# Altium footprint library 2.54-华普微电子模块.PcbLib: 59 footprints (part 4 of 4)
Each footprint in its own frame and in the unit in brackets; x right, y up, seen from the top. Pads: shape width x height; smd on the part's side, far side on the other; paste and mask are expansions set on the pad; w line width, h text height; cw(c..) or ccw(c..) is an arc to the next point about the centre after c.
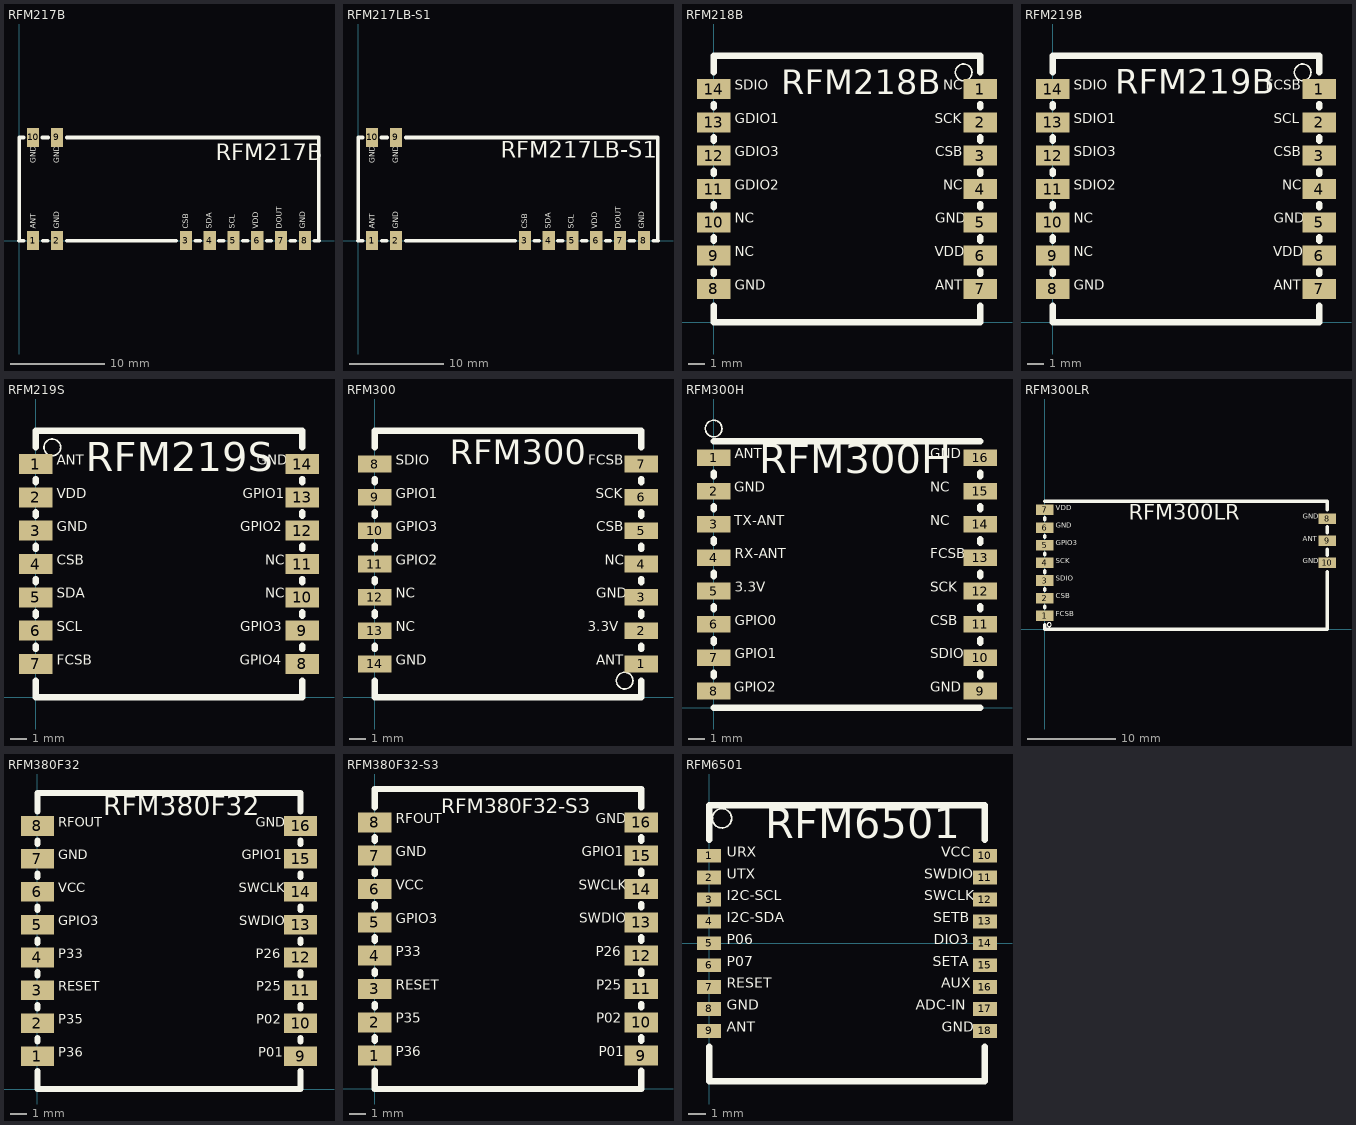
[diagram p3: the footprints below, top view; thin cyan lines are the x and y axes]

## RFM217B [mm]
pads (10):
  rect 1.3x2 smd: 1(1.5,0) 2(4.04,0) 3(17.8,0) 4(20.34,0) 5(22.88,0) 6(25.42,0) 7(27.96,0) 8(30.5,0) 9(4.04,11.01) 10(1.5,11.01)
Top Overlay:
  lines w0.381: -0.004,0 0.504,0 ; 0.5,0 0,0 0,11 0.5,11 ; 2.5,11 3.1,11 ; 2.54,0 3.048,0 ; 5.08,0 16.764,0 ; 5.1,11 32,11 32,0 ; 18.796,0 19.304,0 ; 21.336,0 21.844,0 ; 23.876,0 24.384,0 ; 26.416,0 26.924,0 ; 28.956,0 29.464,0 ; 31.496,0 32.004,0
  text "RFM217B" at 21,8 h3
  text "ANT" at 2,1.25 h1
  text "GND" at 4.5,1.25 h1
  text "CSB" at 18.25,1.25 h1
  text "SDA" at 20.75,1.25 h1
  text "SCL" at 23.25,1.25 h1
  text "VDD" at 25.75,1.25 h1
  text "DOUT" at 28.25,1.25 h1
  text "GND" at 30.75,1.25 h1
  text "GND" at 4.5,8.25 h1
  text "GND" at 2,8.25 h1

## RFM217LB-S1 [mm]
pads (10):
  rect 1.3x2 smd: 1(1.5,0) 2(4.04,0) 3(17.8,0) 4(20.34,0) 5(22.88,0) 6(25.42,0) 7(27.96,0) 8(30.5,0) 9(4.04,11.01) 10(1.5,11.01)
Top Overlay:
  lines w0.381: -0.004,0 0.504,0 ; 0.5,0 0,0 0,11 0.5,11 ; 2.5,11 3.1,11 ; 2.54,0 3.048,0 ; 5.08,0 16.764,0 ; 5.1,11 32,11 32,0 ; 18.796,0 19.304,0 ; 21.336,0 21.844,0 ; 23.876,0 24.384,0 ; 26.416,0 26.924,0 ; 28.956,0 29.464,0 ; 31.496,0 32.004,0
  text "GND" at 2,8.25 h1
  text "GND" at 4.5,8.25 h1
  text "GND" at 30.75,1.25 h1
  text "DOUT" at 28.25,1.25 h1
  text "VDD" at 25.75,1.25 h1
  text "SCL" at 23.25,1.25 h1
  text "SDA" at 20.75,1.25 h1
  text "CSB" at 18.25,1.25 h1
  text "GND" at 4.5,1.25 h1
  text "ANT" at 2,1.25 h1
  text "RFM217LB-S1" at 15.25,8.25 h3

## RFM218B [mm]
pads (14):
  rect 2x1.2 smd: 1(16,14) 2(16,12) 3(16,10) 4(16,8) 5(16,6) 6(16,4) 7(16,2) 8(0,2) 9(0,4) 10(0,6) 11(0,8) 12(0,10) 13(0,12) 14(0,14)
Top Overlay:
  circle w0.1: c15,15 r0.5
  lines w0.381: 0,1 0,0 16,0 16,1 ; 0,2.9 0,3.1 ; 0,4.9 0,5.1 ; 0,6.9 0,7.1 ; 0,8.9 0,9.1 ; 0,10.9 0,11.1 ; 0,12.9 0,13.1 ; 0,15 0,16 16,16 16,15 ; 16,2.9 16,3.1 ; 16,4.9 16,5.1 ; 16,6.9 16,7.1 ; 16,8.9 16,9.1 ; 16,10.9 16,11.1 ; 16,12.9 16,13.1
  text "ANT" at 13.284,1.75 h1
  text "VDD" at 13.267,3.75 h1
  text "GND" at 13.295,5.75 h1
  text "NC" at 13.789,7.75 h1
  text "CSB" at 13.291,9.75 h1
  text "SCK" at 13.275,11.75 h1
  text "NC" at 13.789,13.75 h1
  text "GND" at 1.25,1.75 h1
  text "NC" at 1.25,3.75 h1
  text "NC" at 1.25,5.75 h1
  text "GDIO2" at 1.25,7.75 h1
  text "GDIO3" at 1.25,9.75 h1
  text "GDIO1" at 1.25,11.75 h1
  text "SDIO" at 1.25,13.75 h1
  text "RFM218B" at 4.064,13.208 h2.5

## RFM219B [mm]
pads (14):
  rect 2x1.2 smd: 1(16,14) 2(16,12) 3(16,10) 4(16,8) 5(16,6) 6(16,4) 7(16,2) 8(0,2) 9(0,4) 10(0,6) 11(0,8) 12(0,10) 13(0,12) 14(0,14)
Top Overlay:
  circle w0.1: c15,15 r0.5
  lines w0.381: 0,1 0,0 16,0 16,1 ; 0,2.9 0,3.1 ; 0,4.9 0,5.1 ; 0,6.9 0,7.1 ; 0,8.9 0,9.1 ; 0,10.9 0,11.1 ; 0,12.9 0,13.1 ; 0,15 0,16 16,16 16,15 ; 16,2.9 16,3.1 ; 16,4.9 16,5.1 ; 16,6.9 16,7.1 ; 16,8.9 16,9.1 ; 16,10.9 16,11.1 ; 16,12.9 16,13.1
  text "RFM219B" at 3.75,13.25 h2.5
  text "SDIO" at 1.25,13.75 h1
  text "SDIO1" at 1.25,11.75 h1
  text "SDIO3" at 1.25,9.75 h1
  text "SDIO2" at 1.25,7.75 h1
  text "NC" at 1.25,5.75 h1
  text "NC" at 1.25,3.75 h1
  text "GND" at 1.25,1.75 h1
  text "FCSB" at 12.781,13.75 h1
  text "SCL" at 13.275,11.75 h1
  text "CSB" at 13.268,9.75 h1
  text "NC" at 13.766,7.75 h1
  text "GND" at 13.272,5.75 h1
  text "VDD" at 13.244,3.75 h1
  text "ANT" at 13.261,1.75 h1

## RFM219S [mm]
pads (14):
  rect 2x1.2 smd: 1(0,14) 2(0,12) 3(0,10) 4(0,8) 5(0,6) 6(0,4) 7(0,2) 8(16,2) 9(16,4) 10(16,6) 11(16,8) 12(16,10) 13(16,12) 14(16,14)
Top Overlay:
  circle w0.1: c1,15 r0.5
  lines w0.381: 0,1 0,0 16,0 16,1 ; 0,2.9 0,3.1 ; 0,4.9 0,5.1 ; 0,6.9 0,7.1 ; 0,8.9 0,9.1 ; 0,10.9 0,11.1 ; 0,12.9 0,13.1 ; 0,15 0,16 16,16 16,15 ; 16,2.9 16,3.1 ; 16,4.9 16,5.1 ; 16,6.9 16,7.1 ; 16,8.9 16,9.1 ; 16,10.9 16,11.1 ; 16,12.9 16,13.1
  text "GPIO4" at 12.25,1.75 h1
  text "GPIO3" at 12.289,3.75 h1
  text "NC" at 13.766,5.75 h1
  text "NC" at 13.766,7.75 h1
  text "GPIO2" at 12.289,9.75 h1
  text "GPIO1" at 12.433,11.75 h1
  text "GND" at 13.272,13.75 h1
  text "FCSB" at 1.25,1.75 h1
  text "SCL" at 1.25,3.75 h1
  text "SDA" at 1.25,5.75 h1
  text "CSB" at 1.25,7.75 h1
  text "GND" at 1.25,9.75 h1
  text "VDD" at 1.25,11.75 h1
  text "ANT" at 1.25,13.75 h1
  text "RFM219S" at 3,13 h3

## RFM300 [mm]
pads (14):
  rect 2x1 smd: 1(16,2) 2(16,4) 3(16,6) 4(16,8) 5(16,10) 6(16,12) 7(16,14) 8(0,14) 9(0,12) 10(0,10) 11(0,8) 12(0,6) 13(0,4) 14(0,2)
Top Overlay:
  circle w0.1: c15,1 r0.5
  lines w0.381: 0,1 0,0 16,0 16,1 ; 0,2.9 0,3.1 ; 0,4.9 0,5.1 ; 0,6.9 0,7.1 ; 0,8.9 0,9.1 ; 0,10.9 0,11.1 ; 0,12.9 0,13.1 ; 0,15 0,16 16,16 16,15 ; 16,2.9 16,3.1 ; 16,4.9 16,5.1 ; 16,6.9 16,7.1 ; 16,8.9 16,9.1 ; 16,10.9 16,11.1 ; 16,12.9 16,13.1
  text "ANT" at 13.288,1.75 h1
  text "3.3V" at 12.784,3.75 h1
  text "GND" at 13.299,5.75 h1
  text "NC" at 13.794,7.75 h1
  text "CSB" at 13.296,9.75 h1
  text "SCK" at 13.28,11.75 h1
  text "FCSB" at 12.808,13.75 h1
  text "GND" at 1.25,1.75 h1
  text "NC" at 1.25,3.75 h1
  text "NC" at 1.25,5.75 h1
  text "GPIO2" at 1.25,7.75 h1
  text "GPIO3" at 1.25,9.75 h1
  text "GPIO1" at 1.25,11.75 h1
  text "SDIO" at 1.25,13.75 h1
  text "RFM300" at 4.5,13.5 h2.5

## RFM300H [mm]
pads (16):
  rect 2x1 smd: 1(0,15) 2(0,13) 3(0,11) 4(0,9) 5(0,7) 6(0,5) 7(0,3) 8(0,1) 9(16,1) 10(16,3) 11(16,5) 12(16,7) 13(16,9) 14(16,11) 15(16,13) 16(16,15)
Top Overlay:
  circle w0.1: c0,16.75 r0.5
  lines w0.381: 0,0 16,0 ; 0,1.9 0,2.1 ; 0,3.9 0,4.1 ; 0,5.9 0,6.1 ; 0,7.9 0,8.1 ; 0,9.9 0,10.1 ; 0,11.9 0,12.1 ; 0,13.9 0,14.1 ; 0,16 16,16 ; 16,1.9 16,2.1 ; 16,3.9 16,4.1 ; 16,5.9 16,6.1 ; 16,7.9 16,8.1 ; 16,9.9 16,10.1 ; 16,11.9 16,12.1 ; 16,13.9 16,14.1
  text "RFM300H" at 2.75,13.5 h3
  text "ANT" at 1.25,14.75 h1
  text "GND" at 1.249,12.75 h1
  text "TX-ANT" at 1.249,10.75 h1
  text "RX-ANT" at 1.25,8.75 h1
  text "GPIO2" at 1.249,0.75 h1
  text "GPIO1" at 1.25,2.75 h1
  text "GPIO0" at 1.25,4.75 h1
  text "3.3V" at 1.25,6.75 h1
  text "FCSB" at 13,8.75 h1
  text "NC" at 12.999,10.75 h1
  text "NC" at 12.999,12.75 h1
  text "GND" at 13,14.75 h1
  text "SCK" at 13,6.75 h1
  text "CSB" at 13,4.75 h1
  text "SDIO" at 13,2.75 h1
  text "GND" at 13,0.75 h1

## RFM300LR [mm]
pads (10):
  rect 2x1.2 smd: 1(0,1.5) 2(0,3.5) 3(0,5.5) 4(0,7.5) 5(0,9.5) 6(0,11.5) 7(0,13.5) 8(32,12.5) 9(32,10) 10(32,7.5)
Top Overlay:
  circle w0.1: c0.5,0.5 r0.224
  lines w0.381: 0,0.5 0,0 32,0 32,6.5 ; 0,2.4 0,2.6 ; 0,4.4 0,4.6 ; 0,6.4 0,6.6 ; 0,8.4 0,8.6 ; 0,10.4 0,10.6 ; 0,12.4 0,12.6 ; 0,14.5 32,14.5 32,13.5 ; 32,8.35 32,9.05 ; 32,10.9 32,11.6
  text "RFM300LR" at 9.5,11.75 h3
  text "GND" at 29.25,7.25 h1
  text "ANT" at 29.25,9.75 h1
  text "GND" at 29.25,12.25 h1
  text "VDD" at 1.25,13.25 h1
  text "GND" at 1.25,11.25 h1
  text "GPIO3" at 1.25,9.25 h1
  text "SCK" at 1.25,7.25 h1
  text "SDIO" at 1.25,5.25 h1
  text "CSB" at 1.25,3.25 h1
  text "FCSB" at 1.25,1.25 h1

## RFM380F32 [mm]
pads (16):
  rect 2x1.2 smd: 1(0,2) 2(0,4) 3(0,6) 4(0,8) 5(0,10) 6(0,12) 7(0,14) 8(0,16) 9(16,2) 10(16,4) 11(16,6) 12(16,8) 13(16,10) 14(16,12) 15(16,14) 16(16,16)
Top Overlay:
  lines w0.381: 0,1.1 0,0 16,0 16,1.1 ; 0,2.9 0,3.1 ; 0,4.9 0,5.1 ; 0,6.9 0,7.1 ; 0,8.9 0,9.1 ; 0,10.9 0,11.1 ; 0,12.9 0,13.1 ; 0,14.9 0,15.1 ; 0,16.9 0,18 16,18 16,16.9 ; 16,2.9 16,3.1 ; 16,4.9 16,5.1 ; 16,6.9 16,7.1 ; 16,8.9 16,9.1 ; 16,10.9 16,11.1 ; 16,12.9 16,13.1 ; 16,14.9 16,15.1
  text "RFM380F32" at 4,16.25 h2
  text "GND" at 13.268,15.75 h1
  text "RFOUT" at 1.25,15.75 h1
  text "GPIO1" at 12.429,13.75 h1
  text "SWCLK" at 12.25,11.75 h1
  text "SWDIO" at 12.266,9.75 h1
  text "P26" at 13.266,7.75 h1
  text "P25" at 13.298,5.75 h1
  text "P02" at 13.299,3.75 h1
  text "P01" at 13.444,1.75 h1
  text "GND" at 1.25,13.75 h1
  text "VCC" at 1.25,11.75 h1
  text "GPIO3" at 1.25,9.75 h1
  text "P33" at 1.25,7.75 h1
  text "RESET" at 1.25,5.75 h1
  text "P35" at 1.25,3.75 h1
  text "P36" at 1.25,1.75 h1

## RFM380F32-S3 [mm]
pads (16):
  rect 2x1.2 smd: 1(0,2) 2(0,4) 3(0,6) 4(0,8) 5(0,10) 6(0,12) 7(0,14) 8(0,16) 9(16,2) 10(16,4) 11(16,6) 12(16,8) 13(16,10) 14(16,12) 15(16,14) 16(16,16)
Top Overlay:
  lines w0.381: 0,1.1 0,0 16,0 16,1.1 ; 0,2.9 0,3.1 ; 0,4.9 0,5.1 ; 0,6.9 0,7.1 ; 0,8.9 0,9.1 ; 0,10.9 0,11.1 ; 0,12.9 0,13.1 ; 0,14.9 0,15.1 ; 0,16.9 0,18 16,18 16,16.9 ; 16,2.9 16,3.1 ; 16,4.9 16,5.1 ; 16,6.9 16,7.1 ; 16,8.9 16,9.1 ; 16,10.9 16,11.1 ; 16,12.9 16,13.1 ; 16,14.9 16,15.1
  text "RFM380F32-S3" at 4,16.25 h1.5
  text "GND" at 13.268,15.75 h1
  text "RFOUT" at 1.25,15.75 h1
  text "GPIO1" at 12.429,13.75 h1
  text "SWCLK" at 12.25,11.75 h1
  text "SWDIO" at 12.266,9.75 h1
  text "P26" at 13.266,7.75 h1
  text "P25" at 13.298,5.75 h1
  text "P02" at 13.299,3.75 h1
  text "P01" at 13.444,1.75 h1
  text "GND" at 1.25,13.75 h1
  text "VCC" at 1.25,11.75 h1
  text "GPIO3" at 1.25,9.75 h1
  text "P33" at 1.25,7.75 h1
  text "RESET" at 1.25,5.75 h1
  text "P35" at 1.25,3.75 h1
  text "P36" at 1.25,1.75 h1

## RFM6501 [mm]
pads (18):
  rect 1.4x0.8 smd: 1(0,5.08) 2(0,3.81) 3(0,2.54) 4(0,1.27) 5(0,0) 6(0,-1.27) 7(0,-2.54) 8(0,-3.81) 9(0,-5.08) 10(16.002,5.08) 11(16.002,3.81) 12(16.002,2.54) 13(16.002,1.27) 14(16.002,0) 15(16.002,-1.27) 16(16.002,-2.54) 17(16.002,-3.81) 18(16.002,-5.08)
Top Overlay:
  circle w0.1: c0.75,7.25 r0.559
  lines w0.381: 0,-6 0,-8 8,-8 16,-8 16,-6 ; 0,6 0,8 8,8 16,8 16,6
  text "RFM6501" at 3.25,5.5 h3
  text "URX" at 1.016,4.826 h1
  text "VCC" at 13.462,4.826 h1
  text "SWDIO" at 12.496,3.556 h1
  text "UTX" at 1.016,3.556 h1
  text "SWCLK" at 12.48,2.286 h1
  text "I2C-SCL" at 1.016,2.286 h1
  text "SETB" at 12.995,1.016 h1
  text "I2C-SDA" at 1.016,1.016 h1
  text "DIO3" at 13.022,-0.254 h1
  text "P06" at 1.016,-0.254 h1
  text "SETA" at 12.976,-1.524 h1
  text "P07" at 1.016,-1.524 h1
  text "AUX" at 13.463,-2.794 h1
  text "RESET" at 1.016,-2.794 h1
  text "ADC-IN" at 11.989,-4.064 h1
  text "GND" at 1.016,-4.064 h1
  text "GND" at 13.498,-5.334 h1
  text "ANT" at 1.016,-5.334 h1